# Altium integrated library Altium_WCAP-ATLI_rev19a.IntLib: 162 symbols (part 1 of 2)
Pins are listed as number, name and electrical type; pins without a type are passive.

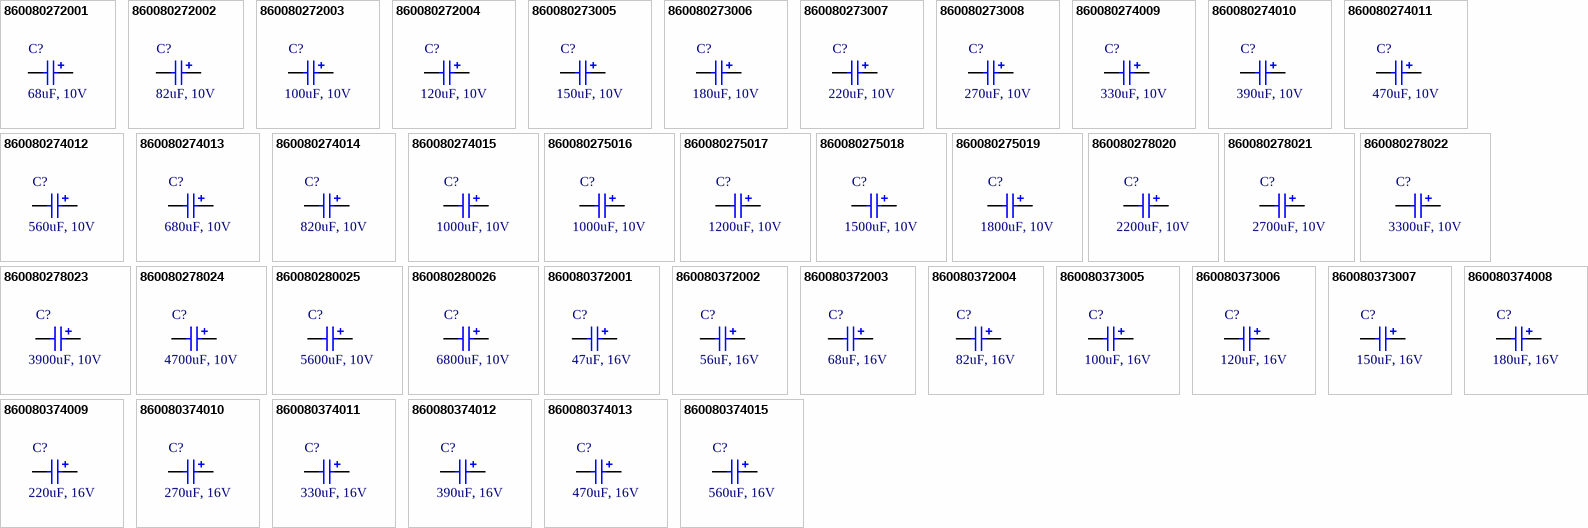
[diagram p0: symbols 860080272001 to 860080374015]

## 860080272001
designator C?, comment 68uF, 10V
WCAP-ATLI THT Aluminum Electrolytic Capacitors, D5mm x L11mm, 68uF, +/-20%, 10VDC; Part Number: 860080272001; Dissipation Factor: 14%; Endurance: 2000h; Leakage Current: 6.8uA; Ripple Current max.: 190mA; Technical Reference: ATEC110680M010DSPA3B000; ComponentLink1Description: Manufacturer; ComponentLink1URL: http://www.we-online.de; ComponentLink2Description: Datasheet; ComponentLink2URL: https://katalog.we-online.com/pbs/datasheet/860080272001.pdf; Length: 11mm; Mounting Technology: THT; Operating Temperature: -55 to +105degC; Packaging: Ammo Pack; Published Date: August 2019; Capacitance: 68uF; Diameter: 5mm; Publisher: Wurth Elektronik; Capacitance Tolerance: +/-20%; Rated Voltage: 10VDC
footprint WCAP-ATLI_5x11
pins: 1 N, 2 P

## 860080272002
designator C?, comment 82uF, 10V
WCAP-ATLI THT Aluminum Electrolytic Capacitors, D5mm x L11mm, 82uF, +/-20%, 10VDC; Part Number: 860080272002; Dissipation Factor: 14%; Endurance: 2000h; Leakage Current: 8.2uA; Ripple Current max.: 210mA; Technical Reference: ATEC110820M010DSPA3B000; ComponentLink1Description: Manufacturer; ComponentLink1URL: http://www.we-online.de; ComponentLink2Description: Datasheet; ComponentLink2URL: https://katalog.we-online.com/pbs/datasheet/860080272002.pdf; Length: 11mm; Mounting Technology: THT; Operating Temperature: -55 to +105degC; Packaging: Ammo Pack; Published Date: August 2019; Capacitance: 82uF; Diameter: 5mm; Publisher: Wurth Elektronik; Capacitance Tolerance: +/-20%; Rated Voltage: 10VDC
footprint WCAP-ATLI_5x11
pins: 1 N, 2 P

## 860080272003
designator C?, comment 100uF, 10V
WCAP-ATLI THT Aluminum Electrolytic Capacitors, D5mm x L11mm, 100uF, +/-20%, 10VDC; Part Number: 860080272003; Dissipation Factor: 14%; Endurance: 2000h; Leakage Current: 10uA; Ripple Current max.: 242mA; Technical Reference: ATEC110101M010DSPA3B000; ComponentLink1Description: Manufacturer; ComponentLink1URL: http://www.we-online.de; ComponentLink2Description: Datasheet; ComponentLink2URL: https://katalog.we-online.com/pbs/datasheet/860080272003.pdf; Length: 11mm; Mounting Technology: THT; Operating Temperature: -55 to +105degC; Packaging: Ammo Pack; Published Date: August 2019; Capacitance: 100uF; Diameter: 5mm; Publisher: Wurth Elektronik; Capacitance Tolerance: +/-20%; Rated Voltage: 10VDC
footprint WCAP-ATLI_5x11
pins: 1 N, 2 P

## 860080272004
designator C?, comment 120uF, 10V
WCAP-ATLI THT Aluminum Electrolytic Capacitors, D5mm x L11mm, 120uF, +/-20%, 10VDC; Part Number: 860080272004; Dissipation Factor: 14%; Endurance: 2000h; Leakage Current: 12uA; Ripple Current max.: 261mA; Technical Reference: ATEC110121M010DSPA3B000; ComponentLink1Description: Manufacturer; ComponentLink1URL: http://www.we-online.de; ComponentLink2Description: Datasheet; ComponentLink2URL: https://katalog.we-online.com/pbs/datasheet/860080272004.pdf; Length: 11mm; Mounting Technology: THT; Operating Temperature: -55 to +105degC; Packaging: Ammo Pack; Published Date: August 2019; Capacitance: 120uF; Diameter: 5mm; Publisher: Wurth Elektronik; Capacitance Tolerance: +/-20%; Rated Voltage: 10VDC
footprint WCAP-ATLI_5x11
pins: 1 N, 2 P

## 860080273005
designator C?, comment 150uF, 10V
WCAP-ATLI THT Aluminum Electrolytic Capacitors, D6.3mm x L11mm, 150uF, +/-20%, 10VDC; Part Number: 860080273005; Dissipation Factor: 14%; Endurance: 2000h; Leakage Current: 15uA; Ripple Current max.: 300mA; Technical Reference: ATED110151M010DSPA4B000; ComponentLink1Description: Manufacturer; ComponentLink1URL: http://www.we-online.de; ComponentLink2Description: Datasheet; ComponentLink2URL: https://katalog.we-online.com/pbs/datasheet/860080273005.pdf; Length: 11mm; Mounting Technology: THT; Operating Temperature: -55 to +105degC; Packaging: Ammo Pack; Published Date: August 2019; Capacitance: 150uF; Diameter: 6.3mm; Publisher: Wurth Elektronik; Capacitance Tolerance: +/-20%; Rated Voltage: 10VDC
footprint WCAP-ATLI_6.3x11
pins: 1 N, 2 P

## 860080273006
designator C?, comment 180uF, 10V
WCAP-ATLI THT Aluminum Electrolytic Capacitors, D6.3mm x L11mm, 180uF, +/-20%, 10VDC; Part Number: 860080273006; Dissipation Factor: 14%; Endurance: 2000h; Leakage Current: 18uA; Ripple Current max.: 350mA; Technical Reference: ATED110181M010DSPA4B000; ComponentLink1Description: Manufacturer; ComponentLink1URL: http://www.we-online.de; ComponentLink2Description: Datasheet; ComponentLink2URL: https://katalog.we-online.com/pbs/datasheet/860080273006.pdf; Length: 11mm; Mounting Technology: THT; Operating Temperature: -55 to +105degC; Packaging: Ammo Pack; Published Date: August 2019; Capacitance: 180uF; Diameter: 6.3mm; Publisher: Wurth Elektronik; Capacitance Tolerance: +/-20%; Rated Voltage: 10VDC
footprint WCAP-ATLI_6.3x11
pins: 1 N, 2 P

## 860080273007
designator C?, comment 220uF, 10V
WCAP-ATLI THT Aluminum Electrolytic Capacitors, D6.3mm x L11mm, 220uF, +/-20%, 10VDC; Part Number: 860080273007; Dissipation Factor: 14%; Endurance: 2000h; Leakage Current: 22uA; Ripple Current max.: 390mA; Technical Reference: ATED110221M010DSPA4B000; ComponentLink1Description: Manufacturer; ComponentLink1URL: http://www.we-online.de; ComponentLink2Description: Datasheet; ComponentLink2URL: https://katalog.we-online.com/pbs/datasheet/860080273007.pdf; Length: 11mm; Mounting Technology: THT; Operating Temperature: -55 to +105degC; Packaging: Ammo Pack; Published Date: August 2019; Capacitance: 220uF; Diameter: 6.3mm; Publisher: Wurth Elektronik; Capacitance Tolerance: +/-20%; Rated Voltage: 10VDC
footprint WCAP-ATLI_6.3x11
pins: 1 N, 2 P

## 860080273008
designator C?, comment 270uF, 10V
WCAP-ATLI THT Aluminum Electrolytic Capacitors, D6.3mm x L15mm, 270uF, +/-20%, 10VDC; Part Number: 860080273008; Dissipation Factor: 14%; Endurance: 2000h; Leakage Current: 27uA; Ripple Current max.: 460mA; Technical Reference: ATED150271M010DSPA4B000; ComponentLink1Description: Manufacturer; ComponentLink1URL: http://www.we-online.de; ComponentLink2Description: Datasheet; ComponentLink2URL: https://katalog.we-online.com/pbs/datasheet/860080273008.pdf; Length: 15mm; Mounting Technology: THT; Operating Temperature: -55 to +105degC; Packaging: Ammo Pack; Published Date: August 2019; Capacitance: 270uF; Diameter: 6.3mm; Publisher: Wurth Elektronik; Capacitance Tolerance: +/-20%; Rated Voltage: 10VDC
footprint WCAP-ATLI_6.3x15
pins: 1 N, 2 P

## 860080274009
designator C?, comment 330uF, 10V
WCAP-ATLI THT Aluminum Electrolytic Capacitors, D8mm x L11.5mm, 330uF, +/-20%, 10VDC; Part Number: 860080274009; Dissipation Factor: 14%; Endurance: 3000h; Leakage Current: 33uA; Ripple Current max.: 540mA; Technical Reference: ATEE115331M010DSPA7C000; ComponentLink1Description: Manufacturer; ComponentLink1URL: http://www.we-online.de; ComponentLink2Description: Datasheet; ComponentLink2URL: https://katalog.we-online.com/pbs/datasheet/860080274009.pdf; Length: 11.5mm; Mounting Technology: THT; Operating Temperature: -55 to +105degC; Packaging: Ammo Pack; Published Date: August 2019; Capacitance: 330uF; Diameter: 8mm; Publisher: Wurth Elektronik; Capacitance Tolerance: +/-20%; Rated Voltage: 10VDC
footprint WCAP-ATLI_8x11.5
pins: 1 N, 2 P

## 860080274010
designator C?, comment 390uF, 10V
WCAP-ATLI THT Aluminum Electrolytic Capacitors, D8mm x L11.5mm, 390uF, +/-20%, 10VDC; Part Number: 860080274010; Dissipation Factor: 14%; Endurance: 3000h; Leakage Current: 39uA; Ripple Current max.: 620mA; Technical Reference: ATEE115391M010DSPA7C000; ComponentLink1Description: Manufacturer; ComponentLink1URL: http://www.we-online.de; ComponentLink2Description: Datasheet; ComponentLink2URL: https://katalog.we-online.com/pbs/datasheet/860080274010.pdf; Length: 11.5mm; Mounting Technology: THT; Operating Temperature: -55 to +105degC; Packaging: Ammo Pack; Published Date: August 2019; Capacitance: 390uF; Diameter: 8mm; Publisher: Wurth Elektronik; Capacitance Tolerance: +/-20%; Rated Voltage: 10VDC
footprint WCAP-ATLI_8x11.5
pins: 1 N, 2 P

## 860080274011
designator C?, comment 470uF, 10V
WCAP-ATLI THT Aluminum Electrolytic Capacitors, D8mm x L11.5mm, 470uF, +/-20%, 10VDC; Part Number: 860080274011; Dissipation Factor: 14%; Endurance: 3000h; Leakage Current: 47uA; Ripple Current max.: 750mA; Technical Reference: ATEE115471M010DSPA7C000; ComponentLink1Description: Manufacturer; ComponentLink1URL: http://www.we-online.de; ComponentLink2Description: Datasheet; ComponentLink2URL: https://katalog.we-online.com/pbs/datasheet/860080274011.pdf; Length: 11.5mm; Mounting Technology: THT; Operating Temperature: -55 to +105degC; Packaging: Ammo Pack; Published Date: August 2019; Capacitance: 470uF; Diameter: 8mm; Publisher: Wurth Elektronik; Capacitance Tolerance: +/-20%; Rated Voltage: 10VDC
footprint WCAP-ATLI_8x11.5
pins: 1 N, 2 P

## 860080274012
designator C?, comment 560uF, 10V
WCAP-ATLI THT Aluminum Electrolytic Capacitors, D8mm x L16mm, 560uF, +/-20%, 10VDC; Part Number: 860080274012; Dissipation Factor: 14%; Endurance: 3000h; Leakage Current: 56uA; Ripple Current max.: 870mA; Technical Reference: ATEE160561M010DSPA7C000; ComponentLink1Description: Manufacturer; ComponentLink1URL: http://www.we-online.de; ComponentLink2Description: Datasheet; ComponentLink2URL: https://katalog.we-online.com/pbs/datasheet/860080274012.pdf; Length: 16mm; Mounting Technology: THT; Operating Temperature: -55 to +105degC; Packaging: Ammo Pack; Published Date: August 2019; Capacitance: 560uF; Diameter: 8mm; Publisher: Wurth Elektronik; Capacitance Tolerance: +/-20%; Rated Voltage: 10VDC
footprint WCAP-ATLI_8x16
pins: 1 N, 2 P

## 860080274013
designator C?, comment 680uF, 10V
WCAP-ATLI THT Aluminum Electrolytic Capacitors, D8mm x L20mm, 680uF, +/-20%, 10VDC; Part Number: 860080274013; Dissipation Factor: 14%; Endurance: 3000h; Leakage Current: 68uA; Ripple Current max.: 1010mA; Technical Reference: ATEE200681M010DSPA7C000; ComponentLink1Description: Manufacturer; ComponentLink1URL: http://www.we-online.de; ComponentLink2Description: Datasheet; ComponentLink2URL: https://katalog.we-online.com/pbs/datasheet/860080274013.pdf; Length: 20mm; Mounting Technology: THT; Operating Temperature: -55 to +105degC; Packaging: Ammo Pack; Published Date: August 2019; Capacitance: 680uF; Diameter: 8mm; Publisher: Wurth Elektronik; Capacitance Tolerance: +/-20%; Rated Voltage: 10VDC
footprint WCAP-ATLI_8x20
pins: 1 N, 2 P

## 860080274014
designator C?, comment 820uF, 10V
WCAP-ATLI THT Aluminum Electrolytic Capacitors, D8mm x L20mm, 820uF, +/-20%, 10VDC; Part Number: 860080274014; Dissipation Factor: 14%; Endurance: 3000h; Leakage Current: 82uA; Ripple Current max.: 1030mA; Technical Reference: ATEE200821M010DSPA7C000; ComponentLink1Description: Manufacturer; ComponentLink1URL: http://www.we-online.de; ComponentLink2Description: Datasheet; ComponentLink2URL: https://katalog.we-online.com/pbs/datasheet/860080274014.pdf; Length: 20mm; Mounting Technology: THT; Operating Temperature: -55 to +105degC; Packaging: Ammo Pack; Published Date: August 2019; Capacitance: 820uF; Diameter: 8mm; Publisher: Wurth Elektronik; Capacitance Tolerance: +/-20%; Rated Voltage: 10VDC
footprint WCAP-ATLI_8x20
pins: 1 N, 2 P

## 860080274015
designator C?, comment 1000uF, 10V
WCAP-ATLI THT Aluminum Electrolytic Capacitors, D8mm x L20mm, 1000uF, +/-20%, 10VDC; Part Number: 860080274015; Dissipation Factor: 14%; Endurance: 3000h; Leakage Current: 100uA; Ripple Current max.: 1220mA; Technical Reference: ATEE200102M010DSPA7C000; ComponentLink1Description: Manufacturer; ComponentLink1URL: http://www.we-online.de; ComponentLink2Description: Datasheet; ComponentLink2URL: https://katalog.we-online.com/pbs/datasheet/860080274015.pdf; Length: 20mm; Mounting Technology: THT; Operating Temperature: -55 to +105degC; Packaging: Ammo Pack; Published Date: August 2019; Capacitance: 1000uF; Diameter: 8mm; Publisher: Wurth Elektronik; Capacitance Tolerance: +/-20%; Rated Voltage: 10VDC
footprint WCAP-ATLI_8x20
pins: 1 N, 2 P

## 860080275016
designator C?, comment 1000uF, 10V
WCAP-ATLI THT Aluminum Electrolytic Capacitors, D10mm x L16mm, 1000uF, +/-20%, 10VDC; Part Number: 860080275016; Dissipation Factor: 14%; Endurance: 5000h; Leakage Current: 100uA; Ripple Current max.: 1400mA; Technical Reference: ATEF160102M010DSPAAE000; ComponentLink1Description: Manufacturer; ComponentLink1URL: http://www.we-online.de; ComponentLink2Description: Datasheet; ComponentLink2URL: https://katalog.we-online.com/pbs/datasheet/860080275016.pdf; Length: 16mm; Mounting Technology: THT; Operating Temperature: -55 to +105degC; Packaging: Ammo Pack; Published Date: August 2019; Capacitance: 1000uF; Diameter: 10mm; Publisher: Wurth Elektronik; Capacitance Tolerance: +/-20%; Rated Voltage: 10VDC
footprint WCAP-ATLI_10x16
pins: 1 N, 2 P

## 860080275017
designator C?, comment 1200uF, 10V
WCAP-ATLI THT Aluminum Electrolytic Capacitors, D10mm x L20mm, 1200uF, +/-20%, 10VDC; Part Number: 860080275017; Dissipation Factor: 14%; Endurance: 5000h; Leakage Current: 120uA; Ripple Current max.: 1560mA; Technical Reference: ATEF200122M010DSPAAE000; ComponentLink1Description: Manufacturer; ComponentLink1URL: http://www.we-online.de; ComponentLink2Description: Datasheet; ComponentLink2URL: https://katalog.we-online.com/pbs/datasheet/860080275017.pdf; Length: 20mm; Mounting Technology: THT; Operating Temperature: -55 to +105degC; Packaging: Ammo Pack; Published Date: August 2019; Capacitance: 1200uF; Diameter: 10mm; Publisher: Wurth Elektronik; Capacitance Tolerance: +/-20%; Rated Voltage: 10VDC
footprint WCAP-ATLI_10x20
pins: 1 N, 2 P

## 860080275018
designator C?, comment 1500uF, 10V
WCAP-ATLI THT Aluminum Electrolytic Capacitors, D10mm x L20mm, 1500uF, +/-20%, 10VDC; Part Number: 860080275018; Dissipation Factor: 14%; Endurance: 5000h; Leakage Current: 150uA; Ripple Current max.: 1670mA; Technical Reference: ATEF200152M010DSPAAE000; ComponentLink1Description: Manufacturer; ComponentLink1URL: http://www.we-online.de; ComponentLink2Description: Datasheet; ComponentLink2URL: https://katalog.we-online.com/pbs/datasheet/860080275018.pdf; Length: 20mm; Mounting Technology: THT; Operating Temperature: -55 to +105degC; Packaging: Ammo Pack; Published Date: August 2019; Capacitance: 1500uF; Diameter: 10mm; Publisher: Wurth Elektronik; Capacitance Tolerance: +/-20%; Rated Voltage: 10VDC
footprint WCAP-ATLI_10x20
pins: 1 N, 2 P

## 860080275019
designator C?, comment 1800uF, 10V
WCAP-ATLI THT Aluminum Electrolytic Capacitors, D10mm x L25mm, 1800uF, +/-20%, 10VDC; Part Number: 860080275019; Dissipation Factor: 14%; Endurance: 5000h; Leakage Current: 180uA; Ripple Current max.: 2000mA; Technical Reference: ATEF250182M010DSPAAE000; ComponentLink1Description: Manufacturer; ComponentLink1URL: http://www.we-online.de; ComponentLink2Description: Datasheet; ComponentLink2URL: https://katalog.we-online.com/pbs/datasheet/860080275019.pdf; Length: 25mm; Mounting Technology: THT; Operating Temperature: -55 to +105degC; Packaging: Ammo Pack; Published Date: August 2019; Capacitance: 1800uF; Diameter: 10mm; Publisher: Wurth Elektronik; Capacitance Tolerance: +/-20%; Rated Voltage: 10VDC
footprint WCAP-ATLI_10x25
pins: 1 N, 2 P

## 860080278020
designator C?, comment 2200uF, 10V
WCAP-ATLI THT Aluminum Electrolytic Capacitors, D13mm x L20mm, 2200uF, +/-20%, 10VDC; Part Number: 860080278020; Dissipation Factor: 16%; Endurance: 5000h; Leakage Current: 220uA; Ripple Current max.: 2370mA; Technical Reference: ATEI200222M010DSPACE000; ComponentLink1Description: Manufacturer; ComponentLink1URL: http://www.we-online.de; ComponentLink2Description: Datasheet; ComponentLink2URL: https://katalog.we-online.com/pbs/datasheet/860080278020.pdf; Length: 20mm; Mounting Technology: THT; Operating Temperature: -55 to +105degC; Packaging: Ammo Pack; Published Date: August 2019; Capacitance: 2200uF; Diameter: 13mm; Publisher: Wurth Elektronik; Capacitance Tolerance: +/-20%; Rated Voltage: 10VDC
footprint WCAP-ATLI_13x20
pins: 1 N, 2 P

## 860080278021
designator C?, comment 2700uF, 10V
WCAP-ATLI THT Aluminum Electrolytic Capacitors, D13mm x L20mm, 2700uF, +/-20%, 10VDC; Part Number: 860080278021; Dissipation Factor: 16%; Endurance: 5000h; Leakage Current: 270uA; Ripple Current max.: 2400mA; Technical Reference: ATEI200272M010DSPACE000; ComponentLink1Description: Manufacturer; ComponentLink1URL: http://www.we-online.de; ComponentLink2Description: Datasheet; ComponentLink2URL: https://katalog.we-online.com/pbs/datasheet/860080278021.pdf; Length: 20mm; Mounting Technology: THT; Operating Temperature: -55 to +105degC; Packaging: Ammo Pack; Published Date: August 2019; Capacitance: 2700uF; Diameter: 13mm; Publisher: Wurth Elektronik; Capacitance Tolerance: +/-20%; Rated Voltage: 10VDC
footprint WCAP-ATLI_13x20
pins: 1 N, 2 P

## 860080278022
designator C?, comment 3300uF, 10V
WCAP-ATLI THT Aluminum Electrolytic Capacitors, D13mm x L25mm, 3300uF, +/-20%, 10VDC; Part Number: 860080278022; Dissipation Factor: 18%; Endurance: 5000h; Leakage Current: 330uA; Ripple Current max.: 2720mA; Technical Reference: ATEI250332M010DSPACE000; ComponentLink1Description: Manufacturer; ComponentLink1URL: http://www.we-online.de; ComponentLink2Description: Datasheet; ComponentLink2URL: https://katalog.we-online.com/pbs/datasheet/860080278022.pdf; Length: 25mm; Mounting Technology: THT; Operating Temperature: -55 to +105degC; Packaging: Ammo Pack; Published Date: August 2019; Capacitance: 3300uF; Diameter: 13mm; Publisher: Wurth Elektronik; Capacitance Tolerance: +/-20%; Rated Voltage: 10VDC
footprint WCAP-ATLI_13x25
pins: 1 N, 2 P

## 860080278023
designator C?, comment 3900uF, 10V
WCAP-ATLI THT Aluminum Electrolytic Capacitors, D13mm x L30mm, 3900uF, +/-20%, 10VDC; Part Number: 860080278023; Dissipation Factor: 18%; Endurance: 5000h; Leakage Current: 390uA; Ripple Current max.: 3000mA; Technical Reference: ATEI300392M010DSPACE000; ComponentLink1Description: Manufacturer; ComponentLink1URL: http://www.we-online.de; ComponentLink2Description: Datasheet; ComponentLink2URL: https://katalog.we-online.com/pbs/datasheet/860080278023.pdf; Length: 30mm; Mounting Technology: THT; Operating Temperature: -55 to +105degC; Packaging: Ammo Pack; Published Date: August 2019; Capacitance: 3900uF; Diameter: 13mm; Publisher: Wurth Elektronik; Capacitance Tolerance: +/-20%; Rated Voltage: 10VDC
footprint WCAP-ATLI_13x30
pins: 1 N, 2 P

## 860080278024
designator C?, comment 4700uF, 10V
WCAP-ATLI THT Aluminum Electrolytic Capacitors, D13mm x L35mm, 4700uF, +/-20%, 10VDC; Part Number: 860080278024; Dissipation Factor: 20%; Endurance: 5000h; Leakage Current: 470uA; Ripple Current max.: 3450mA; Technical Reference: ATEI350472M010DSPABE000; ComponentLink1Description: Manufacturer; ComponentLink1URL: http://www.we-online.de; ComponentLink2Description: Datasheet; ComponentLink2URL: https://katalog.we-online.com/pbs/datasheet/860080278024.pdf; Length: 35mm; Mounting Technology: THT; Operating Temperature: -55 to +105degC; Packaging: Ammo Pack; Published Date: August 2019; Capacitance: 4700uF; Diameter: 13mm; Publisher: Wurth Elektronik; Capacitance Tolerance: +/-20%; Rated Voltage: 10VDC
footprint WCAP-ATLI_13x35
pins: 1 N, 2 P

## 860080280025
designator C?, comment 5600uF, 10V
WCAP-ATLI THT Aluminum Electrolytic Capacitors, D16mm x L31.5mm, 5600uF, +/-20%, 10VDC; Part Number: 860080280025; Dissipation Factor: 22%; Endurance: 5000h; Leakage Current: 560uA; Ripple Current max.: 3460mA; Technical Reference: ATEK315562M010DSPADE000; ComponentLink1Description: Manufacturer; ComponentLink1URL: http://www.we-online.de; ComponentLink2Description: Datasheet; ComponentLink2URL: https://katalog.we-online.com/pbs/datasheet/860080280025.pdf; Length: 31.5mm; Mounting Technology: THT; Operating Temperature: -55 to +105degC; Packaging: Ammo Pack; Published Date: August 2019; Capacitance: 5600uF; Diameter: 16mm; Publisher: Wurth Elektronik; Capacitance Tolerance: +/-20%; Rated Voltage: 10VDC
footprint WCAP-ATLI_16x31.5
pins: 1 N, 2 P

## 860080280026
designator C?, comment 6800uF, 10V
WCAP-ATLI THT Aluminum Electrolytic Capacitors, D16mm x L31.5mm, 6800uF, +/-20%, 10VDC; Part Number: 860080280026; Dissipation Factor: 24%; Endurance: 5000h; Leakage Current: 680uA; Ripple Current max.: 3630mA; Technical Reference: ATEK315682M010DSPADE000; ComponentLink1Description: Manufacturer; ComponentLink1URL: http://www.we-online.de; ComponentLink2Description: Datasheet; ComponentLink2URL: https://katalog.we-online.com/pbs/datasheet/860080280026.pdf; Length: 31.5mm; Mounting Technology: THT; Operating Temperature: -55 to +105degC; Packaging: Ammo Pack; Published Date: August 2019; Capacitance: 6800uF; Diameter: 16mm; Publisher: Wurth Elektronik; Capacitance Tolerance: +/-20%; Rated Voltage: 10VDC
footprint WCAP-ATLI_16x31.5
pins: 1 N, 2 P

## 860080372001
designator C?, comment 47uF, 16V
WCAP-ATLI THT Aluminum Electrolytic Capacitors, D5mm x L11mm, 47uF, +/-20%, 16VDC; Part Number: 860080372001; Dissipation Factor: 12%; Endurance: 2000h; Leakage Current: 7.52uA; Ripple Current max.: 200mA; Technical Reference: ATEC110470M016DSPA3B000; ComponentLink1Description: Manufacturer; ComponentLink1URL: http://www.we-online.de; ComponentLink2Description: Datasheet; ComponentLink2URL: https://katalog.we-online.com/pbs/datasheet/860080372001.pdf; Length: 11mm; Mounting Technology: THT; Operating Temperature: -55 to +105degC; Packaging: Ammo Pack; Published Date: August 2019; Capacitance: 47uF; Diameter: 5mm; Publisher: Wurth Elektronik; Capacitance Tolerance: +/-20%; Rated Voltage: 16VDC
footprint WCAP-ATLI_5x11
pins: 1 N, 2 P

## 860080372002
designator C?, comment 56uF, 16V
WCAP-ATLI THT Aluminum Electrolytic Capacitors, D5mm x L11mm, 56uF, +/-20%, 16VDC; Part Number: 860080372002; Dissipation Factor: 12%; Endurance: 2000h; Leakage Current: 8.96uA; Ripple Current max.: 220mA; Technical Reference: ATEC110560M016DSPA3B000; ComponentLink1Description: Manufacturer; ComponentLink1URL: http://www.we-online.de; ComponentLink2Description: Datasheet; ComponentLink2URL: https://katalog.we-online.com/pbs/datasheet/860080372002.pdf; Length: 11mm; Mounting Technology: THT; Operating Temperature: -55 to +105degC; Packaging: Ammo Pack; Published Date: August 2019; Capacitance: 56uF; Diameter: 5mm; Publisher: Wurth Elektronik; Capacitance Tolerance: +/-20%; Rated Voltage: 16VDC
footprint WCAP-ATLI_5x11
pins: 1 N, 2 P

## 860080372003
designator C?, comment 68uF, 16V
WCAP-ATLI THT Aluminum Electrolytic Capacitors, D5mm x L11mm, 68uF, +/-20%, 16VDC; Part Number: 860080372003; Dissipation Factor: 12%; Endurance: 2000h; Leakage Current: 10.88uA; Ripple Current max.: 230mA; Technical Reference: ATEC110680M016DSPA3B000; ComponentLink1Description: Manufacturer; ComponentLink1URL: http://www.we-online.de; ComponentLink2Description: Datasheet; ComponentLink2URL: https://katalog.we-online.com/pbs/datasheet/860080372003.pdf; Length: 11mm; Mounting Technology: THT; Operating Temperature: -55 to +105degC; Packaging: Ammo Pack; Published Date: August 2019; Capacitance: 68uF; Diameter: 5mm; Publisher: Wurth Elektronik; Capacitance Tolerance: +/-20%; Rated Voltage: 16VDC
footprint WCAP-ATLI_5x11
pins: 1 N, 2 P

## 860080372004
designator C?, comment 82uF, 16V
WCAP-ATLI THT Aluminum Electrolytic Capacitors, D5mm x L11mm, 82uF, +/-20%, 16VDC; Part Number: 860080372004; Dissipation Factor: 12%; Endurance: 2000h; Leakage Current: 13.12uA; Ripple Current max.: 260mA; Technical Reference: ATEC110820M016DSPA3B000; ComponentLink1Description: Manufacturer; ComponentLink1URL: http://www.we-online.de; ComponentLink2Description: Datasheet; ComponentLink2URL: https://katalog.we-online.com/pbs/datasheet/860080372004.pdf; Length: 11mm; Mounting Technology: THT; Operating Temperature: -55 to +105degC; Packaging: Ammo Pack; Published Date: August 2019; Capacitance: 82uF; Diameter: 5mm; Publisher: Wurth Elektronik; Capacitance Tolerance: +/-20%; Rated Voltage: 16VDC
footprint WCAP-ATLI_5x11
pins: 1 N, 2 P

## 860080373005
designator C?, comment 100uF, 16V
WCAP-ATLI THT Aluminum Electrolytic Capacitors, D6.3mm x L11mm, 100uF, +/-20%, 16VDC; Part Number: 860080373005; Dissipation Factor: 12%; Endurance: 2000h; Leakage Current: 16uA; Ripple Current max.: 360mA; Technical Reference: ATED110101M016DSPA4B000; ComponentLink1Description: Manufacturer; ComponentLink1URL: http://www.we-online.de; ComponentLink2Description: Datasheet; ComponentLink2URL: https://katalog.we-online.com/pbs/datasheet/860080373005.pdf; Length: 11mm; Mounting Technology: THT; Operating Temperature: -55 to +105degC; Packaging: Ammo Pack; Published Date: August 2019; Capacitance: 100uF; Diameter: 6.3mm; Publisher: Wurth Elektronik; Capacitance Tolerance: +/-20%; Rated Voltage: 16VDC
footprint WCAP-ATLI_6.3x11
pins: 1 N, 2 P

## 860080373006
designator C?, comment 120uF, 16V
WCAP-ATLI THT Aluminum Electrolytic Capacitors, D6.3mm x L11mm, 120uF, +/-20%, 16VDC; Part Number: 860080373006; Dissipation Factor: 12%; Endurance: 2000h; Leakage Current: 19.2uA; Ripple Current max.: 365mA; Technical Reference: ATED110121M016DSPA4B000; ComponentLink1Description: Manufacturer; ComponentLink1URL: http://www.we-online.de; ComponentLink2Description: Datasheet; ComponentLink2URL: https://katalog.we-online.com/pbs/datasheet/860080373006.pdf; Length: 11mm; Mounting Technology: THT; Operating Temperature: -55 to +105degC; Packaging: Ammo Pack; Published Date: August 2019; Capacitance: 120uF; Diameter: 6.3mm; Publisher: Wurth Elektronik; Capacitance Tolerance: +/-20%; Rated Voltage: 16VDC
footprint WCAP-ATLI_6.3x11
pins: 1 N, 2 P

## 860080373007
designator C?, comment 150uF, 16V
WCAP-ATLI THT Aluminum Electrolytic Capacitors, D6.3mm x L11mm, 150uF, +/-20%, 16VDC; Part Number: 860080373007; Dissipation Factor: 12%; Endurance: 2000h; Leakage Current: 24uA; Ripple Current max.: 385mA; Technical Reference: ATED110151M016DSPA4B000; ComponentLink1Description: Manufacturer; ComponentLink1URL: http://www.we-online.de; ComponentLink2Description: Datasheet; ComponentLink2URL: https://katalog.we-online.com/pbs/datasheet/860080373007.pdf; Length: 11mm; Mounting Technology: THT; Operating Temperature: -55 to +105degC; Packaging: Ammo Pack; Published Date: August 2019; Capacitance: 150uF; Diameter: 6.3mm; Publisher: Wurth Elektronik; Capacitance Tolerance: +/-20%; Rated Voltage: 16VDC
footprint WCAP-ATLI_6.3x11
pins: 1 N, 2 P

## 860080374008
designator C?, comment 180uF, 16V
WCAP-ATLI THT Aluminum Electrolytic Capacitors, D8mm x L11.5mm, 180uF, +/-20%, 16VDC; Part Number: 860080374008; Dissipation Factor: 12%; Endurance: 3000h; Leakage Current: 28.8uA; Ripple Current max.: 520mA; Technical Reference: ATEE115181M016DSPA7C000; ComponentLink1Description: Manufacturer; ComponentLink1URL: http://www.we-online.de; ComponentLink2Description: Datasheet; ComponentLink2URL: https://katalog.we-online.com/pbs/datasheet/860080374008.pdf; Length: 11.5mm; Mounting Technology: THT; Operating Temperature: -55 to +105degC; Packaging: Ammo Pack; Published Date: August 2019; Capacitance: 180uF; Diameter: 8mm; Publisher: Wurth Elektronik; Capacitance Tolerance: +/-20%; Rated Voltage: 16VDC
footprint WCAP-ATLI_8x11.5
pins: 1 N, 2 P

## 860080374009
designator C?, comment 220uF, 16V
WCAP-ATLI THT Aluminum Electrolytic Capacitors, D8mm x L11.5mm, 220uF, +/-20%, 16VDC; Part Number: 860080374009; Dissipation Factor: 12%; Endurance: 3000h; Leakage Current: 35.2uA; Ripple Current max.: 575mA; Technical Reference: ATEE115221M016DSPA7C000; ComponentLink1Description: Manufacturer; ComponentLink1URL: http://www.we-online.de; ComponentLink2Description: Datasheet; ComponentLink2URL: https://katalog.we-online.com/pbs/datasheet/860080374009.pdf; Length: 11.5mm; Mounting Technology: THT; Operating Temperature: -55 to +105degC; Packaging: Ammo Pack; Published Date: August 2019; Capacitance: 220uF; Diameter: 8mm; Publisher: Wurth Elektronik; Capacitance Tolerance: +/-20%; Rated Voltage: 16VDC
footprint WCAP-ATLI_8x11.5
pins: 1 N, 2 P
